# Altium footprint library connecteurs.PcbLib: 162 footprints (part 1 of 11)
Each footprint in its own frame and in the unit in brackets; x right, y up, seen from the top. Pads: shape width x height; smd on the part's side, far side on the other; paste and mask are expansions set on the pad; w line width, h text height; cw(c..) or ccw(c..) is an arc to the next point about the centre after c.
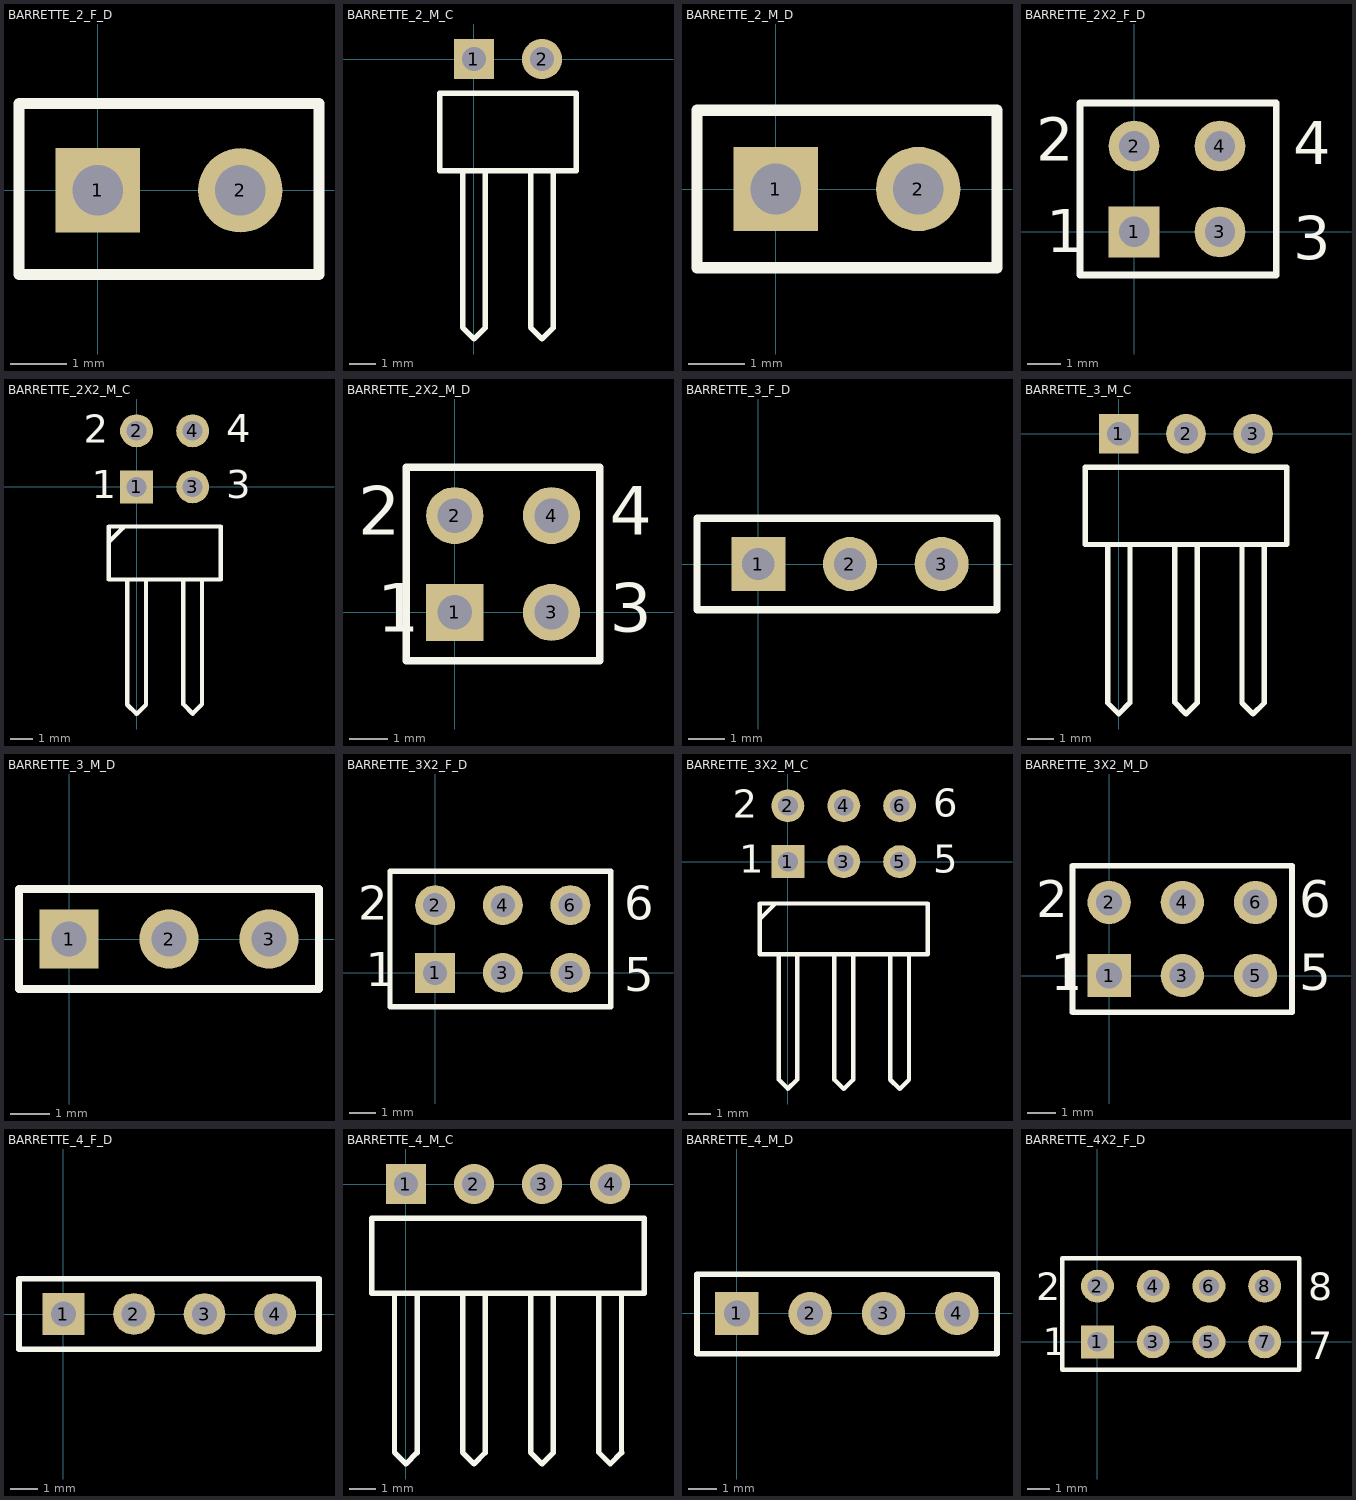
[diagram p0: the footprints below, top view; thin cyan lines are the x and y axes]

## BARRETTE_2_F_D [mm] "BARRETTE 2 CONTACTS ; 1 RANGEE ; DROITE ; FEMELLE ; ESPACEMENT BROCHES = 2.54 mm"
height 8.6
pads (2):
  rect 1.5x1.5 hole 0.9: 1(0,0)
  round 1.5 hole 0.9: 2(2.54,0)
Top Overlay:
  lines w0.2: -1.4,-1.5 -1.4,1.548 3.94,1.548 3.94,-1.5 -1.4,-1.5
3D body: height 8.5, standoff -2.65, extent -1.177,-1.5 3.776,1.548

## BARRETTE_2_M_C [mm] "BARRETTE 2 CONTACTS ; 1 RANGEE ; COUDEE ; MALE ; ESPACEMENT BROCHES = 2.54 mm"
height 2.5
pads (2):
  rect 1.5x1.5 hole 0.9: 1(0,0)
  round 1.5 hole 0.9: 2(2.54,0)
Top Overlay:
  lines w0.2: -0.423,-4.18 -0.423,-10.017 0.003,-10.443 ; 0,-10.44 0.423,-10.017 ; 0.423,-10.02 0.423,-4.18 ; 2.117,-4.18 2.117,-10.017 2.54,-10.44 2.963,-10.017 ; 2.963,-10.02 2.963,-4.17 ; -1.27,-4.17 -1.27,-1.27 3.81,-1.27 3.81,-4.17 -1.27,-4.17
3D body: height 2.45, standoff -2.05, extent -1.34,-10.02 3.74,0.3

## BARRETTE_2_M_D [mm] "BARRETTE 2 CONTACTS ; 1 RANGEE ; DROITE ; MALE ; ESPACEMENT BROCHES = 2.54 mm"
height 9.7
pads (2):
  rect 1.5x1.5 hole 0.9: 1(0,0)
  round 1.5 hole 0.9: 2(2.54,0)
Top Overlay:
  lines w0.2: -1.4,-1.4 3.94,-1.4 3.94,1.4 -1.4,1.4 -1.4,-1.4
3D body: height 8.55, standoff -2.45, extent -1.3,-1.2 3.78,1.3

## BARRETTE_2X2_F_D [mm] "BARRETTE 2 CONTACTS ; 2 RANGEES ; DROITE ; FEMELLE ; ESPACEMENT BROCHES = 2.54 mm"
height 8.6
pads (4):
  rect 1.5x1.5 hole 0.9: 1(0,0)
  round 1.5 hole 0.9: 2(0,2.54) 3(2.54,0) 4(2.54,2.54)
Top Overlay:
  lines w0.2: -1.6,-1.27 4.2,-1.27 4.2,3.81 -1.6,3.81 -1.6,-1.27
  text "3" at 4.7,-0.8 h1.27
  text "4" at 4.7,2 h1.27
  text "2" at -2.9,2.1 h1.27
  text "1" at -2.6,-0.6 h1.27
3D body: height 8.5, standoff -2.65, extent -1.5,-1.2 4.088,3.753

## BARRETTE_2X2_M_C [mm] "BARRETTE 2 CONTACTS ; 2 RANGEES ; COUDEE ; MALE ; ESPACEMENT BROCHES = 2.54 mm"
height 5
pads (4):
  rect 1.5x1.5 hole 0.9: 1(0,0)
  round 1.5 hole 0.9: 2(0,2.54) 3(2.54,0) 4(2.54,2.54)
Top Overlay:
  lines w0.2: -1.27,-2.505 -0.635,-1.87 ; -0.423,-9.86 -0.423,-4.2 ; -0.42,-9.88 -0.02,-10.28 ; 0,-10.3 0.423,-9.877 ; 0.423,-9.86 0.423,-4.2 ; 2.117,-9.86 2.117,-4.2 ; 2.12,-9.86 2.52,-10.26 ; 2.54,-10.28 2.963,-9.857 2.963,-4.2 ; -1.27,-4.2 3.81,-4.2 3.81,-1.8 -1.27,-1.8 -1.27,-4.2
  text "3" at 4.064,-0.508 h1.27
  text "4" at 4.064,2.032 h1.27
  text "2" at -2.4,2 h1.27
  text "1" at -2.032,-0.508 h1.27
3D body: height 5.64, standoff -2.23, extent -1.24,-9.864 3.84,2.9

## BARRETTE_2X2_M_D [mm] "BARRETTE 2 CONTACTS ; 2 RANGEES ; DROITE ; MALE ; ESPACEMENT BROCHES = 2.54 mm"
height 9.7
pads (4):
  rect 1.5x1.5 hole 0.9: 1(0,0)
  round 1.5 hole 0.9: 2(0,2.54) 3(2.54,0) 4(2.54,2.54)
Top Overlay:
  lines w0.2: -1.27,-1.27 -1.27,3.81 3.81,3.81 3.81,-1.27 -1.27,-1.27
  text "1" at -2.032,-0.508 h1.27
  text "2" at -2.54,2.032 h1.27
  text "4" at 4.064,2.032 h1.27
  text "3" at 4.064,-0.508 h1.27
3D body: height 10.67, standoff -2.79, extent -1.3,-1.3 3.78,3.78

## BARRETTE_3_F_D [mm] "BARRETTE 3 CONTACTS ; 1 RANGEE ; DROITE ; FEMELLE ; ESPACEMENT BROCHES = 2.54 mm"
height 8.6
pads (3):
  rect 1.5x1.5 hole 0.9: 1(0,0)
  round 1.5 hole 0.9: 2(2.54,0) 3(5.08,0)
Top Overlay:
  lines w0.2: -1.7,-1.27 6.614,-1.27 6.614,1.242 6.604,1.27 -1.7,1.27 -1.7,-1.27
3D body: height 8.5, standoff -2.65, extent -1.564,-1.213 6.564,1.2

## BARRETTE_3_M_C [mm] "BARRETTE 3 CONTACTS ; 1 RANGEE ; COUDEE ; MALE ; ESPACEMENT BROCHES = 2.54 mm"
height 2.5
pads (3):
  rect 1.5x1.5 hole 0.9: 1(0,0)
  round 1.5 hole 0.9: 2(2.54,0) 3(5.08,0)
Top Overlay:
  lines w0.2: -0.423,-4.2 -0.423,-10.187 -0.005,-10.605 0.42,-10.18 ; 0.423,-10.18 0.423,-4.2 ; 2.117,-4.21 2.117,-10.177 2.545,-10.605 2.963,-10.187 ; 2.963,-10.18 2.963,-4.21 ; 4.657,-10.187 5.08,-10.61 5.503,-10.187 ; 4.657,-10.18 4.657,-4.2 ; 5.503,-10.18 5.503,-4.2 ; -1.27,-4.19 -1.27,-1.27 6.35,-1.27 6.35,-4.19 -1.27,-4.19
3D body: height 3.18, standoff -2.2, extent -1.25,-10.18 6.37,0.3

## BARRETTE_3_M_D [mm] "BARRETTE 3 CONTACTS ; 1 RANGEE ; DROITE ; MALE ; ESPACEMENT BROCHES = 2.54 mm"
height 9.6
pads (3):
  rect 1.5x1.5 hole 0.9: 1(0,0)
  round 1.5 hole 0.9: 2(2.54,0) 3(5.08,0)
Top Overlay:
  lines w0.2: -1.27,-1.27 6.35,-1.27 6.35,1.27 -1.27,1.27 -1.27,-1.27
3D body: height 8.61, standoff -3.58, extent -1.21,-1.42 6.41,1.5

## BARRETTE_3X2_F_D [mm] "BARRETTE 3 CONTACTS ; 2 RANGEES ; DROITE ; FEMELLE ; ESPACEMENT BROCHES = 2.54 mm"
height 8.6
pads (6):
  rect 1.5x1.5 hole 0.9: 1(0,0)
  round 1.5 hole 0.9: 2(0,2.54) 3(2.54,0) 4(2.54,2.54) 5(5.08,0) 6(5.08,2.54)
Top Overlay:
  lines w0.2: 1.482,-1.27 6.35,-1.27 ; 6.35,-1.27 -1.7,-1.27 -1.7,3.81 6.6,3.81 6.6,-1.27 6.35,-1.27
  text "6" at 7.1,2 h1.27
  text "5" at 7.1,-0.7 h1.27
  text "2" at -2.9,2 h1.27
  text "1" at -2.6,-0.5 h1.27
3D body: height 8.5, standoff -2.65, extent -1.564,-1.253 6.564,3.7

## BARRETTE_3X2_M_C [mm] "BARRETTE 3 CONTACTS ; 2 RANGEES ; COUDEE ; MALE ; ESPACEMENT BROCHES = 2.54 mm"
height 5
pads (6):
  rect 1.5x1.5 hole 0.9: 1(0,0)
  round 1.5 hole 0.9: 2(0,2.54) 3(2.54,0) 4(2.54,2.54) 5(5.08,0) 6(5.08,2.54)
Top Overlay:
  lines w0.2: -1.27,-2.605 -0.635,-1.97 ; -0.423,-9.9 -0.423,-4.2 ; -0.42,-9.9 0.003,-10.323 ; 0,-10.32 0.423,-9.897 ; 0.423,-9.9 0.423,-4.2 ; 2.117,-4.2 2.117,-9.907 2.54,-10.33 2.963,-9.907 ; 2.963,-9.9 2.963,-4.2 ; 4.657,-9.907 5.08,-10.33 5.503,-9.907 ; 4.657,-9.9 4.657,-4.2 ; 5.503,-9.9 5.503,-4.2 ; -1.27,-4.2 6.35,-4.2 6.35,-1.9 -1.27,-1.9 -1.27,-4.2
  text "2" at -2.5,2 h1.27
  text "1" at -2.2,-0.5 h1.27
  text "5" at 6.604,-0.508 h1.27
  text "6" at 6.604,2.032 h1.27
3D body: height 5.64, standoff -2.23, extent -1.3,-9.9 6.32,2.863

## BARRETTE_3X2_M_D [mm] "BARRETTE 3 CONTACTS ; 2 RANGEES ; DROITE ; MALE ; ESPACEMENT BROCHES = 2.54 mm"
height 9.6
pads (6):
  rect 1.5x1.5 hole 0.9: 1(0,0)
  round 1.5 hole 0.9: 2(0,2.54) 3(2.54,0) 4(2.54,2.54) 5(5.08,0) 6(5.08,2.54)
Top Overlay:
  lines w0.2: 1.482,-1.27 6.35,-1.27 ; 6.35,-1.27 -1.27,-1.27 -1.27,3.81 6.35,3.81 6.35,-1.27
  text "1" at -2.032,-0.508 h1.27
  text "2" at -2.54,2.032 h1.27
  text "5" at 6.604,-0.508 h1.27
  text "6" at 6.604,2.032 h1.27
3D body: height 10.67, standoff -2.79, extent -1.3,-1.24 6.32,3.84

## BARRETTE_4_F_D [mm] "BARRETTE 4 CONTACTS ; 1 RANGEE ; DROITE ; FEMELLE ; ESPACEMENT BROCHES = 2.54 mm"
height 8.6
pads (4):
  rect 1.5x1.5 hole 0.9: 1(0,0)
  round 1.5 hole 0.9: 2(2.54,0) 3(5.08,0) 4(7.62,0)
Top Overlay:
  lines w0.2: -1.6,-1.27 -1.6,1.27 9.2,1.27 9.2,-1.27 -1.6,-1.27
3D body: height 8.5, standoff -2.65, extent -1.534,-1.213 9.134,1.2

## BARRETTE_4_M_C [mm] "BARRETTE 4 CONTACTS ; 1 RANGEE ; COUDEE ; MALE ; ESPACEMENT BROCHES = 2.54 mm"
height 2.5
pads (4):
  rect 1.5x1.5 hole 0.9: 1(0,0)
  round 1.5 hole 0.9: 2(2.54,0) 3(5.08,0) 4(7.62,0)
Top Overlay:
  lines w0.2: -0.423,-4.1 -0.423,-10.017 0,-10.44 0.42,-10.02 ; 0.423,-10.02 0.423,-4.09 ; 2.117,-4.09 2.117,-10.017 2.54,-10.44 2.96,-10.02 ; 2.963,-10.02 2.963,-4.08 ; 4.657,-4.09 4.657,-10.017 5.085,-10.445 5.51,-10.02 ; 5.503,-10.02 5.503,-4.08 ; 7.197,-4.08 7.197,-10.017 7.625,-10.445 8.05,-10.02 ; 8.043,-10.02 8.043,-4.09 ; -1.27,-4.07 -1.27,-1.27 8.89,-1.27 8.89,-4.07 -1.27,-4.07
3D body: height 2.45, standoff -2.05, extent -1.28,-10.02 8.88,0.3

## BARRETTE_4_M_D [mm] "BARRETTE 4 CONTACTS ; 1 RANGEE ; DROIT ; MALE ; ESPACEMENT BROCHES = 2.54 mm"
height 9.6
pads (4):
  rect 1.5x1.5 hole 0.9: 1(0,0)
  round 1.5 hole 0.9: 2(2.54,0) 3(5.08,0) 4(7.62,0)
Top Overlay:
  lines w0.2: -1.38,-1.4 9.01,-1.4 9.01,1.36 -1.38,1.36 -1.38,-1.4
3D body: height 10.1, standoff -1.5, extent -1.28,-1.3 8.88,1.24

## BARRETTE_4X2_F_D [mm] "BARRETTE 4 CONTACTS ; 2 RANGEES ; DROITE ; FEMELLE ; ESPACEMENT BROCHES = 2.54 mm"
height 8.6
pads (8):
  rect 1.5x1.5 hole 0.9: 1(0,0)
  round 1.5 hole 0.9: 2(0,2.54) 3(2.54,0) 4(2.54,2.54) 5(5.08,0) 6(5.08,2.54) 7(7.62,0) 8(7.62,2.54)
Top Overlay:
  lines w0.2: -1.6,-1.27 -1.6,3.81 9.2,3.81 9.2,-1.27 -1.6,-1.27
  text "8" at 9.6,1.9 h1.27
  text "7" at 9.6,-0.8 h1.27
  text "1" at -2.5,-0.6 h1.27
  text "2" at -2.8,1.9 h1.27
3D body: height 8.5, standoff -2.65, extent -1.534,-1.2 9.134,3.753